# Altium schematic symbol library jlcpcb_2025_04_capacitors_extended_0805.schlib: 3281 symbols (part 15 of 18) (continued)
## GRM21BR61E106MA73L
designator C?  Capacitance: 10uF  (hidden comment: *)
Capacitor, Ceramic (MLCC), 10uF, ±20%, 25V, X5R, ±20%, SMD 0805; Manufacturer: Murata Electronics; Manufacturer Part Number: GRM21BR61E106MA73L; Package Size: 0805; JLCPCB Basic Part: No; JLCPCB Part Number: C391262; Supplier 1: LCSC; Category: Capacitors - MLCC; Supplier Part Number 1: C391262; Tolerance: ±20%; Voltage Rating: 25V; Temperature Coefficient: X5R; RoHS: Yes; ComponentLink1Description: Datasheet; ComponentLink1URL: https://wmsc.lcsc.com/wmsc/upload/file/pdf/v2/lcsc/2304140030_Murata-Electronics-GRM21BR61E106MA73L_C391262.pdf; ComponentLink2Description: JLCPCB Part URL; ComponentLink2URL: https://jlcpcb.com/partdetail/C391262; ComponentLink3Description: LCSC Part URL; ComponentLink3URL: https://lcsc.com/product-detail/Multilayer-Ceramic-Capacitors-MLCC---SMD-SMT_Murata-Electronics-Murata-Electronics-GRM21BR61E106MA73L_C391262.html
footprint CAP-0805 (0805 (2012M) Capacitor)
pins: 1, 2

## GRM21BR61E225KA12L
designator C?  Capacitance: 2.2uF  (hidden comment: *)
Capacitor, Ceramic (MLCC), 2.2uF, ±10%, 25V, X5R, ±10%, SMD 0805; Manufacturer: Murata Electronics; Manufacturer Part Number: GRM21BR61E225KA12L; Package Size: 0805; JLCPCB Basic Part: No; JLCPCB Part Number: C77076; Supplier 1: LCSC; Category: Capacitors - MLCC; Supplier Part Number 1: C77076; Tolerance: ±10%; Voltage Rating: 25V; Temperature Coefficient: X5R; RoHS: Yes; ComponentLink1Description: Datasheet; ComponentLink1URL: https://wmsc.lcsc.com/wmsc/upload/file/pdf/v2/lcsc/2201242300_Murata-Electronics-GRM21BR61E225KA12L_C77076.pdf; ComponentLink2Description: JLCPCB Part URL; ComponentLink2URL: https://jlcpcb.com/partdetail/C77076; ComponentLink3Description: LCSC Part URL; ComponentLink3URL: https://lcsc.com/product-detail/Multilayer-Ceramic-Capacitors-MLCC---SMD-SMT_Murata-Electronics-Murata-Electronics-GRM21BR61E225KA12L_C77076.html
footprint CAP-0805 (0805 (2012M) Capacitor)
pins: 1, 2

## GRM21BR61E226ME44K
designator C?  Capacitance: 22uF  (hidden comment: *)
Capacitor, Ceramic (MLCC), 22uF, ±20%, 25V, X5R, ±20%, SMD 0805; Manufacturer: Murata Electronics; Manufacturer Part Number: GRM21BR61E226ME44K; Package Size: 0805; JLCPCB Basic Part: No; JLCPCB Part Number: C2178186; Supplier 1: LCSC; Category: Capacitors - MLCC; Supplier Part Number 1: C2178186; Tolerance: ±20%; Voltage Rating: 25V; Temperature Coefficient: X5R; RoHS: Yes; ComponentLink1Description: Datasheet; ComponentLink1URL: https://wmsc.lcsc.com/wmsc/upload/file/pdf/v2/lcsc/2202040930_Murata-Electronics-GRM21BR61E226ME44K_C2178186.pdf; ComponentLink2Description: JLCPCB Part URL; ComponentLink2URL: https://jlcpcb.com/partdetail/C2178186; ComponentLink3Description: LCSC Part URL; ComponentLink3URL: https://lcsc.com/product-detail/Multilayer-Ceramic-Capacitors-MLCC---SMD-SMT_Murata-Electronics-Murata-Electronics-GRM21BR61E226ME44K_C2178186.html
footprint CAP-0805 (0805 (2012M) Capacitor)
pins: 1, 2

## GRM21BR61E226ME44L
designator C?  Capacitance: 22uF  (hidden comment: *)
Capacitor, Ceramic (MLCC), 22uF, ±20%, 25V, X5R, ±20%, SMD 0805; Manufacturer: Murata Electronics; Manufacturer Part Number: GRM21BR61E226ME44L; Package Size: 0805; JLCPCB Basic Part: No; JLCPCB Part Number: C86816; Supplier 1: LCSC; Category: Capacitors - MLCC; Supplier Part Number 1: C86816; Tolerance: ±20%; Voltage Rating: 25V; Temperature Coefficient: X5R; RoHS: Yes; ComponentLink1Description: Datasheet; ComponentLink1URL: https://wmsc.lcsc.com/wmsc/upload/file/pdf/v2/lcsc/2304140030_Murata-Electronics-GRM21BR61E226ME44L_C86816.pdf; ComponentLink2Description: JLCPCB Part URL; ComponentLink2URL: https://jlcpcb.com/partdetail/C86816; ComponentLink3Description: LCSC Part URL; ComponentLink3URL: https://lcsc.com/product-detail/Multilayer-Ceramic-Capacitors-MLCC---SMD-SMT_Murata-Electronics-Murata-Electronics-GRM21BR61E226ME44L_C86816.html
footprint CAP-0805 (0805 (2012M) Capacitor)
pins: 1, 2

## GRM21BR61E475KA12L
designator C?  Capacitance: 4.7uF  (hidden comment: *)
Capacitor, Ceramic (MLCC), 4.7uF, ±10%, 25V, X5R, ±10%, SMD 0805; Manufacturer: Murata Electronics; Manufacturer Part Number: GRM21BR61E475KA12L; Package Size: 0805; JLCPCB Basic Part: No; JLCPCB Part Number: C77077; Supplier 1: LCSC; Category: Capacitors - MLCC; Supplier Part Number 1: C77077; Tolerance: ±10%; Voltage Rating: 25V; Temperature Coefficient: X5R; RoHS: Yes; ComponentLink1Description: Datasheet; ComponentLink1URL: https://wmsc.lcsc.com/wmsc/upload/file/pdf/v2/lcsc/2304140030_Murata-Electronics-GRM21BR61E475KA12L_C77077.pdf; ComponentLink2Description: JLCPCB Part URL; ComponentLink2URL: https://jlcpcb.com/partdetail/C77077; ComponentLink3Description: LCSC Part URL; ComponentLink3URL: https://lcsc.com/product-detail/Multilayer-Ceramic-Capacitors-MLCC---SMD-SMT_Murata-Electronics-Murata-Electronics-GRM21BR61E475KA12L_C77077.html
footprint CAP-0805 (0805 (2012M) Capacitor)
pins: 1, 2

## GRM21BR61H106ME43L
designator C?  Capacitance: 10uF  (hidden comment: *)
Capacitor, Ceramic (MLCC), 10uF, ±20%, 50V, X5R, ±20%, SMD 0805; Manufacturer: Murata Electronics; Manufacturer Part Number: GRM21BR61H106ME43L; Package Size: 0805; JLCPCB Basic Part: No; JLCPCB Part Number: C2190942; Supplier 1: LCSC; Category: Capacitors - MLCC; Supplier Part Number 1: C2190942; Tolerance: ±20%; Voltage Rating: 50V; Temperature Coefficient: X5R; RoHS: Yes; ComponentLink1Description: Datasheet; ComponentLink1URL: https://wmsc.lcsc.com/wmsc/upload/file/pdf/v2/lcsc/2202042000_Murata-Electronics-GRM21BR61H106ME43L_C2190942.pdf; ComponentLink2Description: JLCPCB Part URL; ComponentLink2URL: https://jlcpcb.com/partdetail/C2190942; ComponentLink3Description: LCSC Part URL; ComponentLink3URL: https://lcsc.com/product-detail/Multilayer-Ceramic-Capacitors-MLCC---SMD-SMT_Murata-Electronics-Murata-Electronics-GRM21BR61H106ME43L_C2190942.html
footprint CAP-0805 (0805 (2012M) Capacitor)
pins: 1, 2

## GRM21BR61H225KA73L
designator C?  Capacitance: 2.2uF  (hidden comment: *)
Capacitor, Ceramic (MLCC), 2.2uF, ±10%, 50V, X5R, ±10%, SMD 0805; Manufacturer: Murata Electronics; Manufacturer Part Number: GRM21BR61H225KA73L; Package Size: 0805; JLCPCB Basic Part: No; JLCPCB Part Number: C77078; Supplier 1: LCSC; Category: Capacitors - MLCC; Supplier Part Number 1: C77078; Tolerance: ±10%; Voltage Rating: 50V; Temperature Coefficient: X5R; RoHS: Yes; ComponentLink1Description: Datasheet; ComponentLink1URL: https://wmsc.lcsc.com/wmsc/upload/file/pdf/v2/lcsc/2304140030_Murata-Electronics-GRM21BR61H225KA73L_C77078.pdf; ComponentLink2Description: JLCPCB Part URL; ComponentLink2URL: https://jlcpcb.com/partdetail/C77078; ComponentLink3Description: LCSC Part URL; ComponentLink3URL: https://lcsc.com/product-detail/Multilayer-Ceramic-Capacitors-MLCC---SMD-SMT_Murata-Electronics-Murata-Electronics-GRM21BR61H225KA73L_C77078.html
footprint CAP-0805 (0805 (2012M) Capacitor)
pins: 1, 2

## GRM21BR61H475KE51L
designator C?  Capacitance: 4.7uF  (hidden comment: *)
Capacitor, Ceramic (MLCC), 4.7uF, ±10%, 50V, X5R, ±10%, SMD 0805; Manufacturer: Murata Electronics; Manufacturer Part Number: GRM21BR61H475KE51L; Package Size: 0805; JLCPCB Basic Part: No; JLCPCB Part Number: C162420; Supplier 1: LCSC; Category: Capacitors - MLCC; Supplier Part Number 1: C162420; Tolerance: ±10%; Voltage Rating: 50V; Temperature Coefficient: X5R; RoHS: Yes; ComponentLink1Description: Datasheet; ComponentLink1URL: https://wmsc.lcsc.com/wmsc/upload/file/pdf/v2/lcsc/1912111437_Murata-Electronics-GRM21BR61H475KE51L_C162420.pdf; ComponentLink2Description: JLCPCB Part URL; ComponentLink2URL: https://jlcpcb.com/partdetail/C162420; ComponentLink3Description: LCSC Part URL; ComponentLink3URL: https://lcsc.com/product-detail/Multilayer-Ceramic-Capacitors-MLCC---SMD-SMT_Murata-Electronics-Murata-Electronics-GRM21BR61H475KE51L_C162420.html
footprint CAP-0805 (0805 (2012M) Capacitor)
pins: 1, 2

## GRM21BR61H475ME51L
designator C?  Capacitance: 4.7uF  (hidden comment: *)
Capacitor, Ceramic (MLCC), 4.7uF, ±20%, 50V, X5R, ±20%, SMD 0805; Manufacturer: Murata Electronics; Manufacturer Part Number: GRM21BR61H475ME51L; Package Size: 0805; JLCPCB Basic Part: No; JLCPCB Part Number: C162421; Supplier 1: LCSC; Category: Capacitors - MLCC; Supplier Part Number 1: C162421; Tolerance: ±20%; Voltage Rating: 50V; Temperature Coefficient: X5R; RoHS: Yes; ComponentLink1Description: Datasheet; ComponentLink1URL: https://wmsc.lcsc.com/wmsc/upload/file/pdf/v2/lcsc/1810201234_Murata-Electronics-GRM21BR61H475ME51L_C162421.pdf; ComponentLink2Description: JLCPCB Part URL; ComponentLink2URL: https://jlcpcb.com/partdetail/C162421; ComponentLink3Description: LCSC Part URL; ComponentLink3URL: https://lcsc.com/product-detail/Multilayer-Ceramic-Capacitors-MLCC---SMD-SMT_Murata-Electronics-Murata-Electronics-GRM21BR61H475ME51L_C162421.html
footprint CAP-0805 (0805 (2012M) Capacitor)
pins: 1, 2

## GRM21BR70J225KA01L
designator C?  Capacitance: 2.2uF  (hidden comment: *)
Capacitor, Ceramic (MLCC), 2.2uF, ±10%, 6.3V, X7R, ±10%, SMD 0805; Manufacturer: Murata Electronics; Manufacturer Part Number: GRM21BR70J225KA01L; Package Size: 0805; JLCPCB Basic Part: No; JLCPCB Part Number: C527990; Supplier 1: LCSC; Category: Capacitors - MLCC; Supplier Part Number 1: C527990; Tolerance: ±10%; Voltage Rating: 6.3V; Temperature Coefficient: X7R; RoHS: Yes; ComponentLink1Description: Datasheet; ComponentLink1URL: https://wmsc.lcsc.com/wmsc/upload/file/pdf/v2/lcsc/2005150732_Murata-Electronics-GRM21BR70J225KA01L_C527990.pdf; ComponentLink2Description: JLCPCB Part URL; ComponentLink2URL: https://jlcpcb.com/partdetail/C527990; ComponentLink3Description: LCSC Part URL; ComponentLink3URL: https://lcsc.com/product-detail/Multilayer-Ceramic-Capacitors-MLCC---SMD-SMT_Murata-Electronics-Murata-Electronics-GRM21BR70J225KA01L_C527990.html
footprint CAP-0805 (0805 (2012M) Capacitor)
pins: 1, 2

## GRM21BR71A106KA73K
designator C?  Capacitance: 10uF  (hidden comment: *)
Capacitor, Ceramic (MLCC), 10uF, ±10%, 10V, X7R, ±10%, SMD 0805; Manufacturer: Murata Electronics; Manufacturer Part Number: GRM21BR71A106KA73K; Package Size: 0805; JLCPCB Basic Part: No; JLCPCB Part Number: C2167686; Supplier 1: LCSC; Category: Capacitors - MLCC; Supplier Part Number 1: C2167686; Tolerance: ±10%; Voltage Rating: 10V; Temperature Coefficient: X7R; RoHS: Yes; ComponentLink1Description: Datasheet; ComponentLink1URL: https://wmsc.lcsc.com/wmsc/upload/file/pdf/v2/lcsc/2202040230_Murata-Electronics-GRM21BR71A106KA73K_C2167686.pdf; ComponentLink2Description: JLCPCB Part URL; ComponentLink2URL: https://jlcpcb.com/partdetail/C2167686; ComponentLink3Description: LCSC Part URL; ComponentLink3URL: https://lcsc.com/product-detail/Multilayer-Ceramic-Capacitors-MLCC---SMD-SMT_Murata-Electronics-Murata-Electronics-GRM21BR71A106KA73K_C2167686.html
footprint CAP-0805 (0805 (2012M) Capacitor)
pins: 1, 2

## GRM21BR71A106KA73L
designator C?  Capacitance: 10uF  (hidden comment: *)
Capacitor, Ceramic (MLCC), 10uF, ±10%, 10V, X7R, ±10%, SMD 0805; Manufacturer: Murata Electronics; Manufacturer Part Number: GRM21BR71A106KA73L; Package Size: 0805; JLCPCB Basic Part: No; JLCPCB Part Number: C117956; Supplier 1: LCSC; Category: Capacitors - MLCC; Supplier Part Number 1: C117956; Tolerance: ±10%; Voltage Rating: 10V; Temperature Coefficient: X7R; RoHS: Yes; ComponentLink1Description: Datasheet; ComponentLink1URL: https://wmsc.lcsc.com/wmsc/upload/file/pdf/v2/lcsc/2304140030_Murata-Electronics-GRM21BR71A106KA73L_C117956.pdf; ComponentLink2Description: JLCPCB Part URL; ComponentLink2URL: https://jlcpcb.com/partdetail/C117956; ComponentLink3Description: LCSC Part URL; ComponentLink3URL: https://lcsc.com/product-detail/Multilayer-Ceramic-Capacitors-MLCC---SMD-SMT_Murata-Electronics-Murata-Electronics-GRM21BR71A106KA73L_C117956.html
footprint CAP-0805 (0805 (2012M) Capacitor)
pins: 1, 2

## GRM21BR71A106KE51L
designator C?  Capacitance: 10uF  (hidden comment: *)
Capacitor, Ceramic (MLCC), 10uF, ±10%, 10V, X7R, ±10%, SMD 0805; Manufacturer: Murata Electronics; Manufacturer Part Number: GRM21BR71A106KE51L; Package Size: 0805; JLCPCB Basic Part: No; JLCPCB Part Number: C86038; Supplier 1: LCSC; Category: Capacitors - MLCC; Supplier Part Number 1: C86038; Tolerance: ±10%; Voltage Rating: 10V; Temperature Coefficient: X7R; RoHS: Yes; ComponentLink1Description: Datasheet; ComponentLink1URL: https://wmsc.lcsc.com/wmsc/upload/file/pdf/v2/lcsc/2304140030_Murata-Electronics-GRM21BR71A106KE51L_C86038.pdf; ComponentLink2Description: JLCPCB Part URL; ComponentLink2URL: https://jlcpcb.com/partdetail/C86038; ComponentLink3Description: LCSC Part URL; ComponentLink3URL: https://lcsc.com/product-detail/Multilayer-Ceramic-Capacitors-MLCC---SMD-SMT_Murata-Electronics-Murata-Electronics-GRM21BR71A106KE51L_C86038.html
footprint CAP-0805 (0805 (2012M) Capacitor)
pins: 1, 2

## GRM21BR71A225KA01L
designator C?  Capacitance: 2.2uF  (hidden comment: *)
Capacitor, Ceramic (MLCC), 2.2uF, ±10%, 10V, X7R, ±10%, SMD 0805; Manufacturer: Murata Electronics; Manufacturer Part Number: GRM21BR71A225KA01L; Package Size: 0805; JLCPCB Basic Part: No; JLCPCB Part Number: C117966; Supplier 1: LCSC; Category: Capacitors - MLCC; Supplier Part Number 1: C117966; Tolerance: ±10%; Voltage Rating: 10V; Temperature Coefficient: X7R; RoHS: Yes; ComponentLink1Description: Datasheet; ComponentLink1URL: https://wmsc.lcsc.com/wmsc/upload/file/pdf/v2/lcsc/2008031207_Murata-Electronics-GRM21BR71A225KA01L_C117966.pdf; ComponentLink2Description: JLCPCB Part URL; ComponentLink2URL: https://jlcpcb.com/partdetail/C117966; ComponentLink3Description: LCSC Part URL; ComponentLink3URL: https://lcsc.com/product-detail/Multilayer-Ceramic-Capacitors-MLCC---SMD-SMT_Murata-Electronics-Murata-Electronics-GRM21BR71A225KA01L_C117966.html
footprint CAP-0805 (0805 (2012M) Capacitor)
pins: 1, 2

## GRM21BR71A475KE51L
designator C?  Capacitance: 4.7uF  (hidden comment: *)
Capacitor, Ceramic (MLCC), 4.7uF, ±10%, 10V, X7R, ±10%, SMD 0805; Manufacturer: Murata Electronics; Manufacturer Part Number: GRM21BR71A475KE51L; Package Size: 0805; JLCPCB Basic Part: No; JLCPCB Part Number: C415536; Supplier 1: LCSC; Category: Capacitors - MLCC; Supplier Part Number 1: C415536; Tolerance: ±10%; Voltage Rating: 10V; Temperature Coefficient: X7R; RoHS: Yes; ComponentLink1Description: Datasheet; ComponentLink1URL: https://wmsc.lcsc.com/wmsc/upload/file/pdf/v2/lcsc/2304140030_Murata-Electronics-GRM21BR71A475KE51L_C415536.pdf; ComponentLink2Description: JLCPCB Part URL; ComponentLink2URL: https://jlcpcb.com/partdetail/C415536; ComponentLink3Description: LCSC Part URL; ComponentLink3URL: https://lcsc.com/product-detail/Multilayer-Ceramic-Capacitors-MLCC---SMD-SMT_Murata-Electronics-Murata-Electronics-GRM21BR71A475KE51L_C415536.html
footprint CAP-0805 (0805 (2012M) Capacitor)
pins: 1, 2

## GRM21BR71C106KE51L
designator C?  Capacitance: 10uF  (hidden comment: *)
Capacitor, Ceramic (MLCC), 10uF, ±10%, 16V, X7R, ±10%, SMD 0805; Manufacturer: Murata Electronics; Manufacturer Part Number: GRM21BR71C106KE51L; Package Size: 0805; JLCPCB Basic Part: No; JLCPCB Part Number: C408142; Supplier 1: LCSC; Category: Capacitors - MLCC; Supplier Part Number 1: C408142; Tolerance: ±10%; Voltage Rating: 16V; Temperature Coefficient: X7R; RoHS: Yes; ComponentLink1Description: Datasheet; ComponentLink1URL: https://wmsc.lcsc.com/wmsc/upload/file/pdf/v2/lcsc/2209221630_Murata-Electronics-GRM21BR71C106KE51L_C408142.pdf; ComponentLink2Description: JLCPCB Part URL; ComponentLink2URL: https://jlcpcb.com/partdetail/C408142; ComponentLink3Description: LCSC Part URL; ComponentLink3URL: https://lcsc.com/product-detail/Multilayer-Ceramic-Capacitors-MLCC---SMD-SMT_Murata-Electronics-Murata-Electronics-GRM21BR71C106KE51L_C408142.html
footprint CAP-0805 (0805 (2012M) Capacitor)
pins: 1, 2

## GRM21BR71C225KA12L
designator C?  Capacitance: 2.2uF  (hidden comment: *)
Capacitor, Ceramic (MLCC), 2.2uF, ±10%, 16V, X7R, ±10%, SMD 0805; Manufacturer: Murata Electronics; Manufacturer Part Number: GRM21BR71C225KA12L; Package Size: 0805; JLCPCB Basic Part: No; JLCPCB Part Number: C108378; Supplier 1: LCSC; Category: Capacitors - MLCC; Supplier Part Number 1: C108378; Tolerance: ±10%; Voltage Rating: 16V; Temperature Coefficient: X7R; RoHS: Yes; ComponentLink1Description: Datasheet; ComponentLink1URL: https://wmsc.lcsc.com/wmsc/upload/file/pdf/v2/lcsc/2304140030_Murata-Electronics-GRM21BR71C225KA12L_C108378.pdf; ComponentLink2Description: JLCPCB Part URL; ComponentLink2URL: https://jlcpcb.com/partdetail/C108378; ComponentLink3Description: LCSC Part URL; ComponentLink3URL: https://lcsc.com/product-detail/Multilayer-Ceramic-Capacitors-MLCC---SMD-SMT_Murata-Electronics-Murata-Electronics-GRM21BR71C225KA12L_C108378.html
footprint CAP-0805 (0805 (2012M) Capacitor)
pins: 1, 2

## GRM21BR71C335KA73L
designator C?  Capacitance: 3.3uF  (hidden comment: *)
Capacitor, Ceramic (MLCC), 3.3uF, ±10%, 16V, X7R, ±10%, SMD 0805; Manufacturer: Murata Electronics; Manufacturer Part Number: GRM21BR71C335KA73L; Package Size: 0805; JLCPCB Basic Part: No; JLCPCB Part Number: C415525; Supplier 1: LCSC; Category: Capacitors - MLCC; Supplier Part Number 1: C415525; Tolerance: ±10%; Voltage Rating: 16V; Temperature Coefficient: X7R; RoHS: Yes; ComponentLink1Description: Datasheet; ComponentLink1URL: https://wmsc.lcsc.com/wmsc/upload/file/pdf/v2/lcsc/2304140030_Murata-Electronics-GRM21BR71C335KA73L_C415525.pdf; ComponentLink2Description: JLCPCB Part URL; ComponentLink2URL: https://jlcpcb.com/partdetail/C415525; ComponentLink3Description: LCSC Part URL; ComponentLink3URL: https://lcsc.com/product-detail/Multilayer-Ceramic-Capacitors-MLCC---SMD-SMT_Murata-Electronics-Murata-Electronics-GRM21BR71C335KA73L_C415525.html
footprint CAP-0805 (0805 (2012M) Capacitor)
pins: 1, 2

## GRM21BR71C474KA01L
designator C?  Capacitance: 470nF  (hidden comment: *)
Capacitor, Ceramic (MLCC), 470nF, ±10%, 16V, X7R, ±10%, SMD 0805; Manufacturer: Murata Electronics; Manufacturer Part Number: GRM21BR71C474KA01L; Package Size: 0805; JLCPCB Basic Part: No; JLCPCB Part Number: C408143; Supplier 1: LCSC; Category: Capacitors - MLCC; Supplier Part Number 1: C408143; Tolerance: ±10%; Voltage Rating: 16V; Temperature Coefficient: X7R; RoHS: Yes; ComponentLink1Description: Datasheet; ComponentLink1URL: https://wmsc.lcsc.com/wmsc/upload/file/pdf/v2/lcsc/2304140030_Murata-Electronics-GRM21BR71C474KA01L_C408143.pdf; ComponentLink2Description: JLCPCB Part URL; ComponentLink2URL: https://jlcpcb.com/partdetail/C408143; ComponentLink3Description: LCSC Part URL; ComponentLink3URL: https://lcsc.com/product-detail/Multilayer-Ceramic-Capacitors-MLCC---SMD-SMT_Murata-Electronics-Murata-Electronics-GRM21BR71C474KA01L_C408143.html
footprint CAP-0805 (0805 (2012M) Capacitor)
pins: 1, 2

## GRM21BR71C475KA73L
designator C?  Capacitance: 4.7uF  (hidden comment: *)
Capacitor, Ceramic (MLCC), 4.7uF, ±10%, 16V, X7R, ±10%, SMD 0805; Manufacturer: Murata Electronics; Manufacturer Part Number: GRM21BR71C475KA73L; Package Size: 0805; JLCPCB Basic Part: No; JLCPCB Part Number: C86040; Supplier 1: LCSC; Category: Capacitors - MLCC; Supplier Part Number 1: C86040; Tolerance: ±10%; Voltage Rating: 16V; Temperature Coefficient: X7R; RoHS: Yes; ComponentLink1Description: Datasheet; ComponentLink1URL: https://wmsc.lcsc.com/wmsc/upload/file/pdf/v2/lcsc/2304140030_Murata-Electronics-GRM21BR71C475KA73L_C86040.pdf; ComponentLink2Description: JLCPCB Part URL; ComponentLink2URL: https://jlcpcb.com/partdetail/C86040; ComponentLink3Description: LCSC Part URL; ComponentLink3URL: https://lcsc.com/product-detail/Multilayer-Ceramic-Capacitors-MLCC---SMD-SMT_Murata-Electronics-Murata-Electronics-GRM21BR71C475KA73L_C86040.html
footprint CAP-0805 (0805 (2012M) Capacitor)
pins: 1, 2

## GRM21BR71C475KE51L
designator C?  Capacitance: 4.7uF  (hidden comment: *)
Capacitor, Ceramic (MLCC), 4.7uF, ±10%, 16V, X7R, ±10%, SMD 0805; Manufacturer: Murata Electronics; Manufacturer Part Number: GRM21BR71C475KE51L; Package Size: 0805; JLCPCB Basic Part: No; JLCPCB Part Number: C408144; Supplier 1: LCSC; Category: Capacitors - MLCC; Supplier Part Number 1: C408144; Tolerance: ±10%; Voltage Rating: 16V; Temperature Coefficient: X7R; RoHS: Yes; ComponentLink1Description: Datasheet; ComponentLink1URL: https://wmsc.lcsc.com/wmsc/upload/file/pdf/v2/lcsc/2304140030_Murata-Electronics-GRM21BR71C475KE51L_C408144.pdf; ComponentLink2Description: JLCPCB Part URL; ComponentLink2URL: https://jlcpcb.com/partdetail/C408144; ComponentLink3Description: LCSC Part URL; ComponentLink3URL: https://lcsc.com/product-detail/Multilayer-Ceramic-Capacitors-MLCC---SMD-SMT_Murata-Electronics-Murata-Electronics-GRM21BR71C475KE51L_C408144.html
footprint CAP-0805 (0805 (2012M) Capacitor)
pins: 1, 2

## GRM21BR71E104KA01L
designator C?  Capacitance: 100nF  (hidden comment: *)
Capacitor, Ceramic (MLCC), 100nF, ±10%, 25V, X7R, ±10%, SMD 0805; Manufacturer: Murata Electronics; Manufacturer Part Number: GRM21BR71E104KA01L; Package Size: 0805; JLCPCB Basic Part: No; JLCPCB Part Number: C86041; Supplier 1: LCSC; Category: Capacitors - MLCC; Supplier Part Number 1: C86041; Tolerance: ±10%; Voltage Rating: 25V; Temperature Coefficient: X7R; RoHS: Yes; ComponentLink1Description: Datasheet; ComponentLink1URL: https://wmsc.lcsc.com/wmsc/upload/file/pdf/v2/lcsc/2304140030_Murata-Electronics-GRM21BR71E104KA01L_C86041.pdf; ComponentLink2Description: JLCPCB Part URL; ComponentLink2URL: https://jlcpcb.com/partdetail/C86041; ComponentLink3Description: LCSC Part URL; ComponentLink3URL: https://lcsc.com/product-detail/Multilayer-Ceramic-Capacitors-MLCC---SMD-SMT_Murata-Electronics-Murata-Electronics-GRM21BR71E104KA01L_C86041.html
footprint CAP-0805 (0805 (2012M) Capacitor)
pins: 1, 2

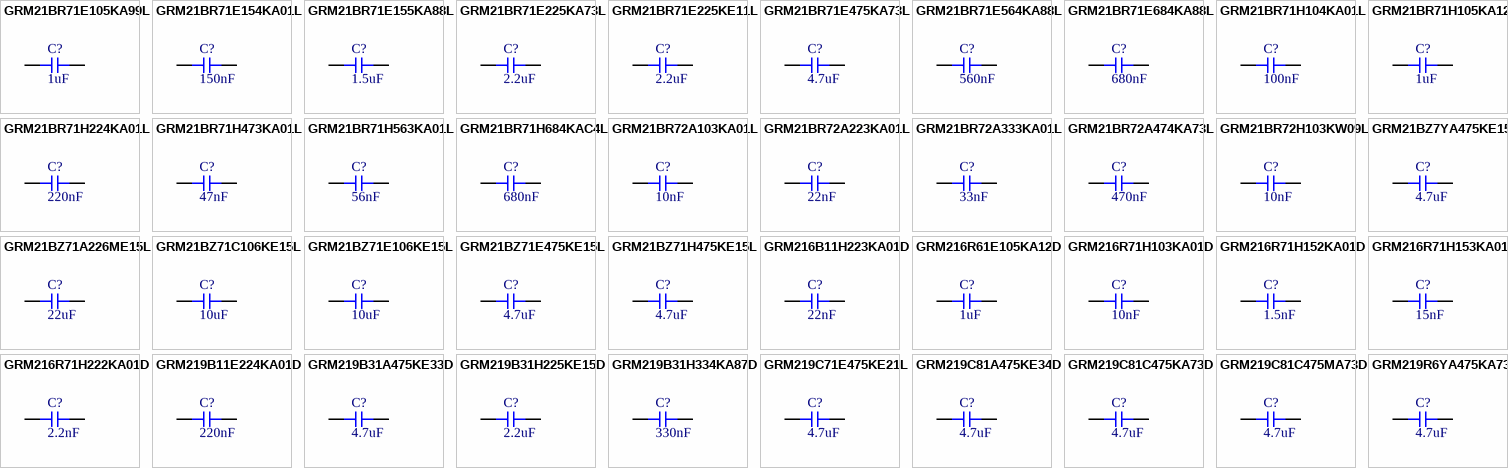
[diagram p67: symbols GRM21BR71E105KA99L to GRM219R6YA475KA73D]

## GRM21BR71E105KA99L
designator C?  Capacitance: 1uF  (hidden comment: *)
Capacitor, Ceramic (MLCC), 1uF, ±10%, 25V, X7R, ±10%, SMD 0805; Manufacturer: Murata Electronics; Manufacturer Part Number: GRM21BR71E105KA99L; Package Size: 0805; JLCPCB Basic Part: No; JLCPCB Part Number: C77080; Supplier 1: LCSC; Category: Capacitors - MLCC; Supplier Part Number 1: C77080; Tolerance: ±10%; Voltage Rating: 25V; Temperature Coefficient: X7R; RoHS: Yes; ComponentLink1Description: Datasheet; ComponentLink1URL: https://wmsc.lcsc.com/wmsc/upload/file/pdf/v2/lcsc/2304140030_Murata-Electronics-GRM21BR71E105KA99L_C77080.pdf; ComponentLink2Description: JLCPCB Part URL; ComponentLink2URL: https://jlcpcb.com/partdetail/C77080; ComponentLink3Description: LCSC Part URL; ComponentLink3URL: https://lcsc.com/product-detail/Multilayer-Ceramic-Capacitors-MLCC---SMD-SMT_Murata-Electronics-Murata-Electronics-GRM21BR71E105KA99L_C77080.html
footprint CAP-0805 (0805 (2012M) Capacitor)
pins: 1, 2

## GRM21BR71E154KA01L
designator C?  Capacitance: 150nF  (hidden comment: *)
Capacitor, Ceramic (MLCC), 150nF, ±10%, 25V, X7R, ±10%, SMD 0805; Manufacturer: Murata Electronics; Manufacturer Part Number: GRM21BR71E154KA01L; Package Size: 0805; JLCPCB Basic Part: No; JLCPCB Part Number: C97918; Supplier 1: LCSC; Category: Capacitors - MLCC; Supplier Part Number 1: C97918; Tolerance: ±10%; Voltage Rating: 25V; Temperature Coefficient: X7R; RoHS: Yes; ComponentLink1Description: Datasheet; ComponentLink1URL: https://wmsc.lcsc.com/wmsc/upload/file/pdf/v2/lcsc/1810201220_Murata-Electronics-GRM21BR71E154KA01L_C97918.pdf; ComponentLink2Description: JLCPCB Part URL; ComponentLink2URL: https://jlcpcb.com/partdetail/C97918; ComponentLink3Description: LCSC Part URL; ComponentLink3URL: https://lcsc.com/product-detail/Multilayer-Ceramic-Capacitors-MLCC---SMD-SMT_Murata-Electronics-Murata-Electronics-GRM21BR71E154KA01L_C97918.html
footprint CAP-0805 (0805 (2012M) Capacitor)
pins: 1, 2

## GRM21BR71E155KA88L
designator C?  Capacitance: 1.5uF  (hidden comment: *)
Capacitor, Ceramic (MLCC), 1.5uF, ±10%, 25V, X7R, ±10%, SMD 0805; Manufacturer: Murata Electronics; Manufacturer Part Number: GRM21BR71E155KA88L; Package Size: 0805; JLCPCB Basic Part: No; JLCPCB Part Number: C162425; Supplier 1: LCSC; Category: Capacitors - MLCC; Supplier Part Number 1: C162425; Tolerance: ±10%; Voltage Rating: 25V; Temperature Coefficient: X7R; RoHS: Yes; ComponentLink1Description: Datasheet; ComponentLink1URL: https://wmsc.lcsc.com/wmsc/upload/file/pdf/v2/lcsc/2304140030_Murata-Electronics-GRM21BR71E155KA88L_C162425.pdf; ComponentLink2Description: JLCPCB Part URL; ComponentLink2URL: https://jlcpcb.com/partdetail/C162425; ComponentLink3Description: LCSC Part URL; ComponentLink3URL: https://lcsc.com/product-detail/Multilayer-Ceramic-Capacitors-MLCC---SMD-SMT_Murata-Electronics-Murata-Electronics-GRM21BR71E155KA88L_C162425.html
footprint CAP-0805 (0805 (2012M) Capacitor)
pins: 1, 2

## GRM21BR71E225KA73L
designator C?  Capacitance: 2.2uF  (hidden comment: *)
Capacitor, Ceramic (MLCC), 2.2uF, ±10%, 25V, X7R, ±10%, SMD 0805; Manufacturer: Murata Electronics; Manufacturer Part Number: GRM21BR71E225KA73L; Package Size: 0805; JLCPCB Basic Part: No; JLCPCB Part Number: C469542; Supplier 1: LCSC; Category: Capacitors - MLCC; Supplier Part Number 1: C469542; Tolerance: ±10%; Voltage Rating: 25V; Temperature Coefficient: X7R; RoHS: Yes; ComponentLink1Description: Datasheet; ComponentLink1URL: https://wmsc.lcsc.com/wmsc/upload/file/pdf/v2/lcsc/1912241611_Murata-Electronics-GRM21BR71E225KA73L_C469542.pdf; ComponentLink2Description: JLCPCB Part URL; ComponentLink2URL: https://jlcpcb.com/partdetail/C469542; ComponentLink3Description: LCSC Part URL; ComponentLink3URL: https://lcsc.com/product-detail/Multilayer-Ceramic-Capacitors-MLCC---SMD-SMT_Murata-Electronics-Murata-Electronics-GRM21BR71E225KA73L_C469542.html
footprint CAP-0805 (0805 (2012M) Capacitor)
pins: 1, 2

## GRM21BR71E225KE11L
designator C?  Capacitance: 2.2uF  (hidden comment: *)
Capacitor, Ceramic (MLCC), 2.2uF, ±10%, 25V, X7R, ±10%, SMD 0805; Manufacturer: Murata Electronics; Manufacturer Part Number: GRM21BR71E225KE11L; Package Size: 0805; JLCPCB Basic Part: No; JLCPCB Part Number: C77081; Supplier 1: LCSC; Category: Capacitors - MLCC; Supplier Part Number 1: C77081; Tolerance: ±10%; Voltage Rating: 25V; Temperature Coefficient: X7R; RoHS: Yes; ComponentLink1Description: Datasheet; ComponentLink1URL: https://wmsc.lcsc.com/wmsc/upload/file/pdf/v2/lcsc/2304140030_Murata-Electronics-GRM21BR71E225KE11L_C77081.pdf; ComponentLink2Description: JLCPCB Part URL; ComponentLink2URL: https://jlcpcb.com/partdetail/C77081; ComponentLink3Description: LCSC Part URL; ComponentLink3URL: https://lcsc.com/product-detail/Multilayer-Ceramic-Capacitors-MLCC---SMD-SMT_Murata-Electronics-Murata-Electronics-GRM21BR71E225KE11L_C77081.html
footprint CAP-0805 (0805 (2012M) Capacitor)
pins: 1, 2

## GRM21BR71E475KA73L
designator C?  Capacitance: 4.7uF  (hidden comment: *)
Capacitor, Ceramic (MLCC), 4.7uF, ±10%, 25V, X7R, ±10%, SMD 0805; Manufacturer: Murata Electronics; Manufacturer Part Number: GRM21BR71E475KA73L; Package Size: 0805; JLCPCB Basic Part: No; JLCPCB Part Number: C162427; Supplier 1: LCSC; Category: Capacitors - MLCC; Supplier Part Number 1: C162427; Tolerance: ±10%; Voltage Rating: 25V; Temperature Coefficient: X7R; RoHS: Yes; ComponentLink1Description: Datasheet; ComponentLink1URL: https://wmsc.lcsc.com/wmsc/upload/file/pdf/v2/lcsc/1912111437_Murata-Electronics-GRM21BR71E475KA73L_C162427.pdf; ComponentLink2Description: JLCPCB Part URL; ComponentLink2URL: https://jlcpcb.com/partdetail/C162427; ComponentLink3Description: LCSC Part URL; ComponentLink3URL: https://lcsc.com/product-detail/Multilayer-Ceramic-Capacitors-MLCC---SMD-SMT_Murata-Electronics-Murata-Electronics-GRM21BR71E475KA73L_C162427.html
footprint CAP-0805 (0805 (2012M) Capacitor)
pins: 1, 2

## GRM21BR71E564KA88L
designator C?  Capacitance: 560nF  (hidden comment: *)
Capacitor, Ceramic (MLCC), 560nF, ±10%, 25V, X7R, ±10%, SMD 0805; Manufacturer: Murata Electronics; Manufacturer Part Number: GRM21BR71E564KA88L; Package Size: 0805; JLCPCB Basic Part: No; JLCPCB Part Number: C117960; Supplier 1: LCSC; Category: Capacitors - MLCC; Supplier Part Number 1: C117960; Tolerance: ±10%; Voltage Rating: 25V; Temperature Coefficient: X7R; RoHS: Yes; ComponentLink1Description: Datasheet; ComponentLink1URL: https://wmsc.lcsc.com/wmsc/upload/file/pdf/v2/lcsc/1810201330_Murata-Electronics-GRM21BR71E564KA88L_C117960.pdf; ComponentLink2Description: JLCPCB Part URL; ComponentLink2URL: https://jlcpcb.com/partdetail/C117960; ComponentLink3Description: LCSC Part URL; ComponentLink3URL: https://lcsc.com/product-detail/Multilayer-Ceramic-Capacitors-MLCC---SMD-SMT_Murata-Electronics-Murata-Electronics-GRM21BR71E564KA88L_C117960.html
footprint CAP-0805 (0805 (2012M) Capacitor)
pins: 1, 2

## GRM21BR71E684KA88L
designator C?  Capacitance: 680nF  (hidden comment: *)
Capacitor, Ceramic (MLCC), 680nF, ±10%, 25V, X7R, ±10%, SMD 0805; Manufacturer: Murata Electronics; Manufacturer Part Number: GRM21BR71E684KA88L; Package Size: 0805; JLCPCB Basic Part: No; JLCPCB Part Number: C469543; Supplier 1: LCSC; Category: Capacitors - MLCC; Supplier Part Number 1: C469543; Tolerance: ±10%; Voltage Rating: 25V; Temperature Coefficient: X7R; RoHS: Yes; ComponentLink1Description: Datasheet; ComponentLink1URL: https://wmsc.lcsc.com/wmsc/upload/file/pdf/v2/lcsc/2009121206_Murata-Electronics-GRM21BR71E684KA88L_C469543.pdf; ComponentLink2Description: JLCPCB Part URL; ComponentLink2URL: https://jlcpcb.com/partdetail/C469543; ComponentLink3Description: LCSC Part URL; ComponentLink3URL: https://lcsc.com/product-detail/Multilayer-Ceramic-Capacitors-MLCC---SMD-SMT_Murata-Electronics-Murata-Electronics-GRM21BR71E684KA88L_C469543.html
footprint CAP-0805 (0805 (2012M) Capacitor)
pins: 1, 2

## GRM21BR71H104KA01L
designator C?  Capacitance: 100nF  (hidden comment: *)
Capacitor, Ceramic (MLCC), 100nF, ±10%, 50V, X7R, ±10%, SMD 0805; Manufacturer: Murata Electronics; Manufacturer Part Number: GRM21BR71H104KA01L; Package Size: 0805; JLCPCB Basic Part: No; JLCPCB Part Number: C77082; Supplier 1: LCSC; Category: Capacitors - MLCC; Supplier Part Number 1: C77082; Tolerance: ±10%; Voltage Rating: 50V; Temperature Coefficient: X7R; RoHS: Yes; ComponentLink1Description: Datasheet; ComponentLink1URL: https://wmsc.lcsc.com/wmsc/upload/file/pdf/v2/lcsc/2304140030_Murata-Electronics-GRM21BR71H104KA01L_C77082.pdf; ComponentLink2Description: JLCPCB Part URL; ComponentLink2URL: https://jlcpcb.com/partdetail/C77082; ComponentLink3Description: LCSC Part URL; ComponentLink3URL: https://lcsc.com/product-detail/Multilayer-Ceramic-Capacitors-MLCC---SMD-SMT_Murata-Electronics-Murata-Electronics-GRM21BR71H104KA01L_C77082.html
footprint CAP-0805 (0805 (2012M) Capacitor)
pins: 1, 2

## GRM21BR71H105KA12L
designator C?  Capacitance: 1uF  (hidden comment: *)
Capacitor, Ceramic (MLCC), 1uF, ±10%, 50V, X7R, ±10%, SMD 0805; Manufacturer: Murata Electronics; Manufacturer Part Number: GRM21BR71H105KA12L; Package Size: 0805; JLCPCB Basic Part: No; JLCPCB Part Number: C77083; Supplier 1: LCSC; Category: Capacitors - MLCC; Supplier Part Number 1: C77083; Tolerance: ±10%; Voltage Rating: 50V; Temperature Coefficient: X7R; RoHS: Yes; ComponentLink1Description: Datasheet; ComponentLink1URL: https://wmsc.lcsc.com/wmsc/upload/file/pdf/v2/lcsc/2304140030_Murata-Electronics-GRM21BR71H105KA12L_C77083.pdf; ComponentLink2Description: JLCPCB Part URL; ComponentLink2URL: https://jlcpcb.com/partdetail/C77083; ComponentLink3Description: LCSC Part URL; ComponentLink3URL: https://lcsc.com/product-detail/Multilayer-Ceramic-Capacitors-MLCC---SMD-SMT_Murata-Electronics-Murata-Electronics-GRM21BR71H105KA12L_C77083.html
footprint CAP-0805 (0805 (2012M) Capacitor)
pins: 1, 2

## GRM21BR71H224KA01L
designator C?  Capacitance: 220nF  (hidden comment: *)
Capacitor, Ceramic (MLCC), 220nF, ±10%, 50V, X7R, ±10%, SMD 0805; Manufacturer: Murata Electronics; Manufacturer Part Number: GRM21BR71H224KA01L; Package Size: 0805; JLCPCB Basic Part: No; JLCPCB Part Number: C86042; Supplier 1: LCSC; Category: Capacitors - MLCC; Supplier Part Number 1: C86042; Tolerance: ±10%; Voltage Rating: 50V; Temperature Coefficient: X7R; RoHS: Yes; ComponentLink1Description: Datasheet; ComponentLink1URL: https://wmsc.lcsc.com/wmsc/upload/file/pdf/v2/lcsc/2304140030_Murata-Electronics-GRM21BR71H224KA01L_C86042.pdf; ComponentLink2Description: JLCPCB Part URL; ComponentLink2URL: https://jlcpcb.com/partdetail/C86042; ComponentLink3Description: LCSC Part URL; ComponentLink3URL: https://lcsc.com/product-detail/Multilayer-Ceramic-Capacitors-MLCC---SMD-SMT_Murata-Electronics-Murata-Electronics-GRM21BR71H224KA01L_C86042.html
footprint CAP-0805 (0805 (2012M) Capacitor)
pins: 1, 2

## GRM21BR71H473KA01L
designator C?  Capacitance: 47nF  (hidden comment: *)
Capacitor, Ceramic (MLCC), 47nF, ±10%, 50V, X7R, ±10%, SMD 0805; Manufacturer: Murata Electronics; Manufacturer Part Number: GRM21BR71H473KA01L; Package Size: 0805; JLCPCB Basic Part: No; JLCPCB Part Number: C97923; Supplier 1: LCSC; Category: Capacitors - MLCC; Supplier Part Number 1: C97923; Tolerance: ±10%; Voltage Rating: 50V; Temperature Coefficient: X7R; RoHS: Yes; ComponentLink1Description: Datasheet; ComponentLink1URL: https://wmsc.lcsc.com/wmsc/upload/file/pdf/v2/lcsc/1810201220_Murata-Electronics-GRM21BR71H473KA01L_C97923.pdf; ComponentLink2Description: JLCPCB Part URL; ComponentLink2URL: https://jlcpcb.com/partdetail/C97923; ComponentLink3Description: LCSC Part URL; ComponentLink3URL: https://lcsc.com/product-detail/Multilayer-Ceramic-Capacitors-MLCC---SMD-SMT_Murata-Electronics-Murata-Electronics-GRM21BR71H473KA01L_C97923.html
footprint CAP-0805 (0805 (2012M) Capacitor)
pins: 1, 2

## GRM21BR71H563KA01L
designator C?  Capacitance: 56nF  (hidden comment: *)
Capacitor, Ceramic (MLCC), 56nF, ±10%, 50V, X7R, ±10%, SMD 0805; Manufacturer: Murata Electronics; Manufacturer Part Number: GRM21BR71H563KA01L; Package Size: 0805; JLCPCB Basic Part: No; JLCPCB Part Number: C2987936; Supplier 1: LCSC; Category: Capacitors - MLCC; Supplier Part Number 1: C2987936; Tolerance: ±10%; Voltage Rating: 50V; Temperature Coefficient: X7R; RoHS: Yes; ComponentLink1Description: Datasheet; ComponentLink1URL: https://wmsc.lcsc.com/wmsc/upload/file/pdf/v2/lcsc/2207111830_Murata-Electronics-GRM21BR71H563KA01L_C2987936.pdf; ComponentLink2Description: JLCPCB Part URL; ComponentLink2URL: https://jlcpcb.com/partdetail/C2987936; ComponentLink3Description: LCSC Part URL; ComponentLink3URL: https://lcsc.com/product-detail/Multilayer-Ceramic-Capacitors-MLCC---SMD-SMT_Murata-Electronics-Murata-Electronics-GRM21BR71H563KA01L_C2987936.html
footprint CAP-0805 (0805 (2012M) Capacitor)
pins: 1, 2

## GRM21BR71H684KAC4L
designator C?  Capacitance: 680nF  (hidden comment: *)
Capacitor, Ceramic (MLCC), 680nF, ±10%, 50V, X7R, ±10%, SMD 0805; Manufacturer: Murata Electronics; Manufacturer Part Number: GRM21BR71H684KAC4L; Package Size: 0805; JLCPCB Basic Part: No; JLCPCB Part Number: C692640; Supplier 1: LCSC; Category: Capacitors - MLCC; Supplier Part Number 1: C692640; Tolerance: ±10%; Voltage Rating: 50V; Temperature Coefficient: X7R; RoHS: Yes; ComponentLink1Description: Datasheet; ComponentLink1URL: https://wmsc.lcsc.com/wmsc/upload/file/pdf/v2/lcsc/2308111811_Murata-Electronics-GRM21BR71H684KAC4L_C692640.pdf; ComponentLink2Description: JLCPCB Part URL; ComponentLink2URL: https://jlcpcb.com/partdetail/C692640; ComponentLink3Description: LCSC Part URL; ComponentLink3URL: https://lcsc.com/product-detail/Multilayer-Ceramic-Capacitors-MLCC---SMD-SMT_Murata-Electronics-Murata-Electronics-GRM21BR71H684KAC4L_C692640.html
footprint CAP-0805 (0805 (2012M) Capacitor)
pins: 1, 2

## GRM21BR72A103KA01L
designator C?  Capacitance: 10nF  (hidden comment: *)
Capacitor, Ceramic (MLCC), 10nF, ±10%, 100V, X7R, ±10%, SMD 0805; Manufacturer: Murata Electronics; Manufacturer Part Number: GRM21BR72A103KA01L; Package Size: 0805; JLCPCB Basic Part: No; JLCPCB Part Number: C97925; Supplier 1: LCSC; Category: Capacitors - MLCC; Supplier Part Number 1: C97925; Tolerance: ±10%; Voltage Rating: 100V; Temperature Coefficient: X7R; RoHS: Yes; ComponentLink1Description: Datasheet; ComponentLink1URL: https://wmsc.lcsc.com/wmsc/upload/file/pdf/v2/lcsc/1810201220_Murata-Electronics-GRM21BR72A103KA01L_C97925.pdf; ComponentLink2Description: JLCPCB Part URL; ComponentLink2URL: https://jlcpcb.com/partdetail/C97925; ComponentLink3Description: LCSC Part URL; ComponentLink3URL: https://lcsc.com/product-detail/Multilayer-Ceramic-Capacitors-MLCC---SMD-SMT_Murata-Electronics-Murata-Electronics-GRM21BR72A103KA01L_C97925.html
footprint CAP-0805 (0805 (2012M) Capacitor)
pins: 1, 2

## GRM21BR72A223KA01L
designator C?  Capacitance: 22nF  (hidden comment: *)
Capacitor, Ceramic (MLCC), 22nF, ±10%, 100V, X7R, ±10%, SMD 0805; Manufacturer: Murata Electronics; Manufacturer Part Number: GRM21BR72A223KA01L; Package Size: 0805; JLCPCB Basic Part: No; JLCPCB Part Number: C426111; Supplier 1: LCSC; Category: Capacitors - MLCC; Supplier Part Number 1: C426111; Tolerance: ±10%; Voltage Rating: 100V; Temperature Coefficient: X7R; RoHS: Yes; ComponentLink1Description: Datasheet; ComponentLink1URL: https://wmsc.lcsc.com/wmsc/upload/file/pdf/v2/lcsc/2304140030_Murata-Electronics-GRM21BR72A223KA01L_C426111.pdf; ComponentLink2Description: JLCPCB Part URL; ComponentLink2URL: https://jlcpcb.com/partdetail/C426111; ComponentLink3Description: LCSC Part URL; ComponentLink3URL: https://lcsc.com/product-detail/Multilayer-Ceramic-Capacitors-MLCC---SMD-SMT_Murata-Electronics-Murata-Electronics-GRM21BR72A223KA01L_C426111.html
footprint CAP-0805 (0805 (2012M) Capacitor)
pins: 1, 2

## GRM21BR72A333KA01L
designator C?  Capacitance: 33nF  (hidden comment: *)
Capacitor, Ceramic (MLCC), 33nF, ±10%, 100V, X7R, ±10%, SMD 0805; Manufacturer: Murata Electronics; Manufacturer Part Number: GRM21BR72A333KA01L; Package Size: 0805; JLCPCB Basic Part: No; JLCPCB Part Number: C361108; Supplier 1: LCSC; Category: Capacitors - MLCC; Supplier Part Number 1: C361108; Tolerance: ±10%; Voltage Rating: 100V; Temperature Coefficient: X7R; RoHS: Yes; ComponentLink1Description: Datasheet; ComponentLink1URL: https://wmsc.lcsc.com/wmsc/upload/file/pdf/v2/lcsc/2109092030_Murata-Electronics-GRM21BR72A333KA01L_C361108.pdf; ComponentLink2Description: JLCPCB Part URL; ComponentLink2URL: https://jlcpcb.com/partdetail/C361108; ComponentLink3Description: LCSC Part URL; ComponentLink3URL: https://lcsc.com/product-detail/Multilayer-Ceramic-Capacitors-MLCC---SMD-SMT_Murata-Electronics-Murata-Electronics-GRM21BR72A333KA01L_C361108.html
footprint CAP-0805 (0805 (2012M) Capacitor)
pins: 1, 2

## GRM21BR72A474KA73L
designator C?  Capacitance: 470nF  (hidden comment: *)
Capacitor, Ceramic (MLCC), 470nF, ±10%, 100V, X7R, ±10%, SMD 0805; Manufacturer: Murata Electronics; Manufacturer Part Number: GRM21BR72A474KA73L; Package Size: 0805; JLCPCB Basic Part: No; JLCPCB Part Number: C97926; Supplier 1: LCSC; Category: Capacitors - MLCC; Supplier Part Number 1: C97926; Tolerance: ±10%; Voltage Rating: 100V; Temperature Coefficient: X7R; RoHS: Yes; ComponentLink1Description: Datasheet; ComponentLink1URL: https://wmsc.lcsc.com/wmsc/upload/file/pdf/v2/lcsc/1810201233_Murata-Electronics-GRM21BR72A474KA73L_C97926.pdf; ComponentLink2Description: JLCPCB Part URL; ComponentLink2URL: https://jlcpcb.com/partdetail/C97926; ComponentLink3Description: LCSC Part URL; ComponentLink3URL: https://lcsc.com/product-detail/Multilayer-Ceramic-Capacitors-MLCC---SMD-SMT_Murata-Electronics-Murata-Electronics-GRM21BR72A474KA73L_C97926.html
footprint CAP-0805 (0805 (2012M) Capacitor)
pins: 1, 2

## GRM21BR72H103KW09L
designator C?  Capacitance: 10nF  (hidden comment: *)
Capacitor, Ceramic (MLCC), 10nF, ±10%, 500V, X7R, ±10%, SMD 0805; Manufacturer: Murata Electronics; Manufacturer Part Number: GRM21BR72H103KW09L; Package Size: 0805; JLCPCB Basic Part: No; JLCPCB Part Number: C910743; Supplier 1: LCSC; Category: Capacitors - MLCC; Supplier Part Number 1: C910743; Tolerance: ±10%; Voltage Rating: 500V; Temperature Coefficient: X7R; RoHS: Yes; ComponentLink1Description: Datasheet; ComponentLink1URL: https://wmsc.lcsc.com/wmsc/upload/file/pdf/v2/lcsc/2201242100_Murata-Electronics-GRM21BR72H103KW09L_C910743.pdf; ComponentLink2Description: JLCPCB Part URL; ComponentLink2URL: https://jlcpcb.com/partdetail/C910743; ComponentLink3Description: LCSC Part URL; ComponentLink3URL: https://lcsc.com/product-detail/Multilayer-Ceramic-Capacitors-MLCC---SMD-SMT_Murata-Electronics-Murata-Electronics-GRM21BR72H103KW09L_C910743.html
footprint CAP-0805 (0805 (2012M) Capacitor)
pins: 1, 2

## GRM21BZ7YA475KE15L
designator C?  Capacitance: 4.7uF  (hidden comment: *)
Capacitor, Ceramic (MLCC), 4.7uF, ±10%, 35V, ±10%, SMD 0805; Manufacturer: Murata Electronics; Manufacturer Part Number: GRM21BZ7YA475KE15L; Package Size: 0805; JLCPCB Basic Part: No; JLCPCB Part Number: C668361; Supplier 1: LCSC; Category: Capacitors - MLCC; Supplier Part Number 1: C668361; Tolerance: ±10%; Voltage Rating: 35V; RoHS: Yes; ComponentLink1Description: Datasheet; ComponentLink1URL: https://wmsc.lcsc.com/wmsc/upload/file/pdf/v2/lcsc/2208091530_Murata-Electronics-GRM21BZ7YA475KE15L_C668361.pdf; ComponentLink2Description: JLCPCB Part URL; ComponentLink2URL: https://jlcpcb.com/partdetail/C668361; ComponentLink3Description: LCSC Part URL; ComponentLink3URL: https://lcsc.com/product-detail/Multilayer-Ceramic-Capacitors-MLCC---SMD-SMT_Murata-Electronics-Murata-Electronics-GRM21BZ7YA475KE15L_C668361.html
footprint CAP-0805 (0805 (2012M) Capacitor)
pins: 1, 2

## GRM21BZ71A226ME15L
designator C?  Capacitance: 22uF  (hidden comment: *)
Capacitor, Ceramic (MLCC), 22uF, ±20%, 10V, X7R, ±20%, SMD 0805; Manufacturer: Murata Electronics; Manufacturer Part Number: GRM21BZ71A226ME15L; Package Size: 0805; JLCPCB Basic Part: No; JLCPCB Part Number: C907991; Supplier 1: LCSC; Category: Capacitors - MLCC; Supplier Part Number 1: C907991; Tolerance: ±20%; Voltage Rating: 10V; Temperature Coefficient: X7R; RoHS: Yes; ComponentLink1Description: Datasheet; ComponentLink1URL: https://wmsc.lcsc.com/wmsc/upload/file/pdf/v2/lcsc/2201242100_Murata-Electronics-GRM21BZ71A226ME15L_C907991.pdf; ComponentLink2Description: JLCPCB Part URL; ComponentLink2URL: https://jlcpcb.com/partdetail/C907991; ComponentLink3Description: LCSC Part URL; ComponentLink3URL: https://lcsc.com/product-detail/Multilayer-Ceramic-Capacitors-MLCC---SMD-SMT_Murata-Electronics-Murata-Electronics-GRM21BZ71A226ME15L_C907991.html
footprint CAP-0805 (0805 (2012M) Capacitor)
pins: 1, 2

## GRM21BZ71C106KE15L
designator C?  Capacitance: 10uF  (hidden comment: *)
Capacitor, Ceramic (MLCC), 10uF, ±10%, 16V, X7R, ±10%, SMD 0805; Manufacturer: Murata Electronics; Manufacturer Part Number: GRM21BZ71C106KE15L; Package Size: 0805; JLCPCB Basic Part: No; JLCPCB Part Number: C162430; Supplier 1: LCSC; Category: Capacitors - MLCC; Supplier Part Number 1: C162430; Tolerance: ±10%; Voltage Rating: 16V; Temperature Coefficient: X7R; RoHS: Yes; ComponentLink1Description: Datasheet; ComponentLink1URL: https://wmsc.lcsc.com/wmsc/upload/file/pdf/v2/lcsc/1912111437_Murata-Electronics-GRM21BZ71C106KE15L_C162430.pdf; ComponentLink2Description: JLCPCB Part URL; ComponentLink2URL: https://jlcpcb.com/partdetail/C162430; ComponentLink3Description: LCSC Part URL; ComponentLink3URL: https://lcsc.com/product-detail/Multilayer-Ceramic-Capacitors-MLCC---SMD-SMT_Murata-Electronics-Murata-Electronics-GRM21BZ71C106KE15L_C162430.html
footprint CAP-0805 (0805 (2012M) Capacitor)
pins: 1, 2

## GRM21BZ71E106KE15L
designator C?  Capacitance: 10uF  (hidden comment: *)
Capacitor, Ceramic (MLCC), 10uF, ±10%, 25V, X7R, ±10%, SMD 0805; Manufacturer: Murata Electronics; Manufacturer Part Number: GRM21BZ71E106KE15L; Package Size: 0805; JLCPCB Basic Part: No; JLCPCB Part Number: C237493; Supplier 1: LCSC; Category: Capacitors - MLCC; Supplier Part Number 1: C237493; Tolerance: ±10%; Voltage Rating: 25V; Temperature Coefficient: X7R; RoHS: Yes; ComponentLink1Description: Datasheet; ComponentLink1URL: https://wmsc.lcsc.com/wmsc/upload/file/pdf/v2/lcsc/2305301153_Murata-Electronics-GRM21BZ71E106KE15L_C237493.pdf; ComponentLink2Description: JLCPCB Part URL; ComponentLink2URL: https://jlcpcb.com/partdetail/C237493; ComponentLink3Description: LCSC Part URL; ComponentLink3URL: https://lcsc.com/product-detail/Multilayer-Ceramic-Capacitors-MLCC---SMD-SMT_Murata-Electronics-Murata-Electronics-GRM21BZ71E106KE15L_C237493.html
footprint CAP-0805 (0805 (2012M) Capacitor)
pins: 1, 2

## GRM21BZ71E475KE15L
designator C?  Capacitance: 4.7uF  (hidden comment: *)
Capacitor, Ceramic (MLCC), 4.7uF, ±10%, 25V, X7R, ±10%, SMD 0805; Manufacturer: Murata Electronics; Manufacturer Part Number: GRM21BZ71E475KE15L; Package Size: 0805; JLCPCB Basic Part: No; JLCPCB Part Number: C437556; Supplier 1: LCSC; Category: Capacitors - MLCC; Supplier Part Number 1: C437556; Tolerance: ±10%; Voltage Rating: 25V; Temperature Coefficient: X7R; RoHS: Yes; ComponentLink1Description: Datasheet; ComponentLink1URL: https://wmsc.lcsc.com/wmsc/upload/file/pdf/v2/lcsc/2304140030_Murata-Electronics-GRM21BZ71E475KE15L_C437556.pdf; ComponentLink2Description: JLCPCB Part URL; ComponentLink2URL: https://jlcpcb.com/partdetail/C437556; ComponentLink3Description: LCSC Part URL; ComponentLink3URL: https://lcsc.com/product-detail/Multilayer-Ceramic-Capacitors-MLCC---SMD-SMT_Murata-Electronics-Murata-Electronics-GRM21BZ71E475KE15L_C437556.html
footprint CAP-0805 (0805 (2012M) Capacitor)
pins: 1, 2
